# Altium footprint library vertigo.PcbLib: 115 footprints (part 7 of 8)
Each footprint in its own frame and in the unit in brackets; x right, y up, seen from the top. Pads: shape width x height; smd on the part's side, far side on the other; paste and mask are expansions set on the pad; w line width, h text height; cw(c..) or ccw(c..) is an arc to the next point about the centre after c.
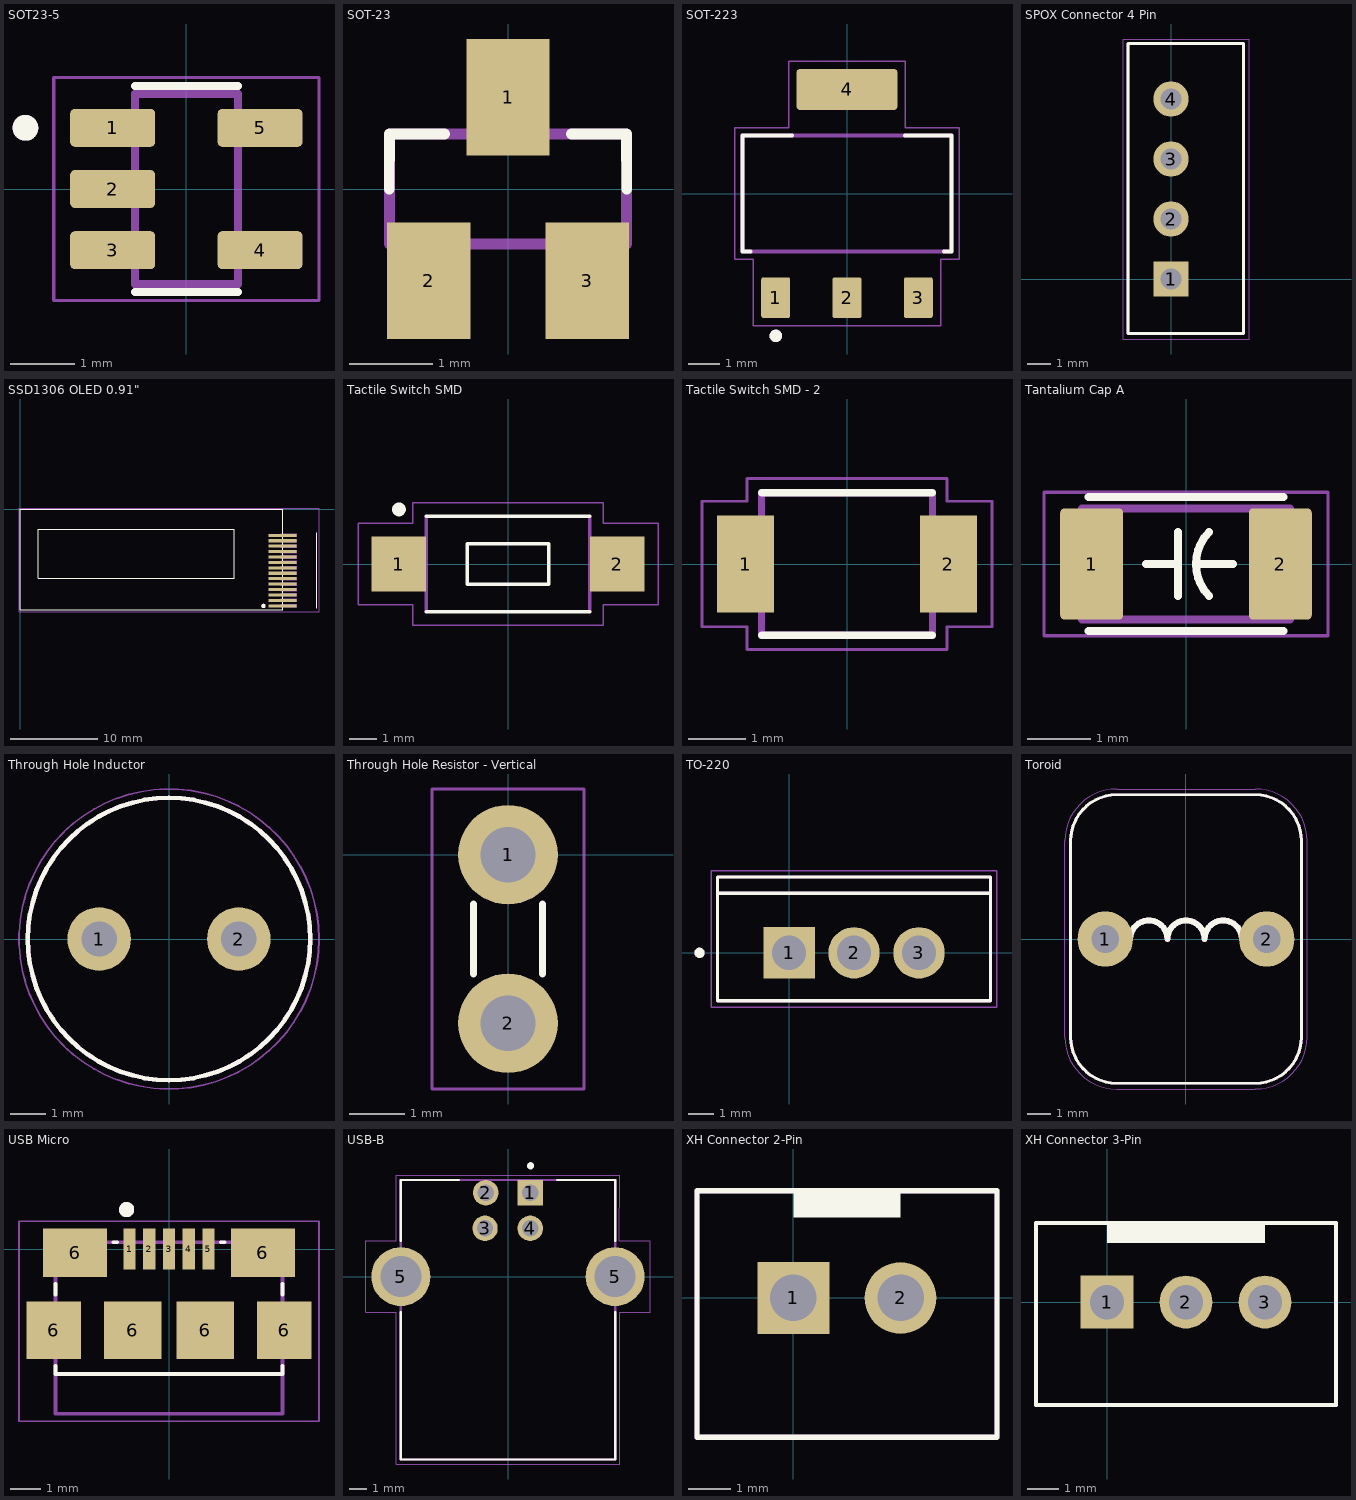
[diagram p6: the footprints below, top view; thin cyan lines are the x and y axes]

## SOT23-5 [mm] "SOT23-5L Package"
pads (5):
  rrect25% 1.32x0.59 smd: 1(-1.145,0.95) 2(-1.145,0) 3(-1.145,-0.95) 4(1.145,-0.95) 5(1.145,0.95)
Top Overlay:
  circle w0.2: c-2.5,0.95 r0.1
  lines w0.127: -0.8,-1.6 0.8,-1.6 ; -0.8,1.6 0.8,1.6
Mechanical 13:
  circle w0.2: c-2.5,0.95 r0.1
  lines w0.127: -0.8,-1.48 0.8,-1.48 0.8,1.48 -0.8,1.48 -0.8,-1.48
Mechanical 15:
  lines w0.05: -2.06,-1.73 -2.06,1.73 2.06,1.73 2.06,-1.73 -2.06,-1.73
3D body "ld3985m33r.stp": height 1.19, standoff 0, extent -1.403,-1.475 1.397,1.475

## SOT-23 [mm] "SOT-23 Package"
pads (3):
  rect 1x1.4 smd: 1(0,1.1) 2(-0.95,-1.1) 3(0.95,-1.1)
Top Overlay:
  lines w0.127: -1.423,0 -1.422,0.66 -0.762,0.66 ; 0.762,0.66 1.422,0.66 1.423,0
Mechanical 13:
  region: 0.229,0.711 -0.229,0.711 -0.229,1.295 0.229,1.295
  region: 1.168,-1.297 0.712,-1.297 0.712,-0.711 1.168,-0.711
  region: -0.711,-1.296 -1.169,-1.296 -1.169,-0.711 -0.711,-0.711
  lines w0.127: -1.422,-0.66 1.422,-0.66 1.422,0.66 -1.422,0.66 -1.422,-0.66
3D body "BCW31--3DModel-STEP-56544.STEP": height 1.14, standoff 0, extent -1.45,-1.2 1.45,1.2

## SOT-223 [mm] "SOT-223 Package"
pads (4):
  rrect15% 0.93x1.31 smd: 1(-2.29,-3.345) 2(0,-3.345) 3(2.29,-3.345)
  rrect15% 3.24x1.31 smd: 4(0,3.345)
Top Overlay:
  circle w0.2: c-2.286,-4.572 r0.1
  lines w0.127: -3.1,-1.86 -3.36,-1.86 -3.36,1.86 -1.76,1.86 ; 1.87,1.86 3.36,1.86 3.36,-1.86 3.11,-1.86
Mechanical 13:
  circle w0.2: c-2.286,-4.572 r0.1
  lines w0.127: -3.36,-1.86 -3.36,1.86 3.36,1.86 3.36,-1.86 -3.36,-1.86
Mechanical 15:
  lines w0.05: -3.61,-2.11 -3.61,2.11 -1.87,2.11 -1.87,4.25 1.87,4.25 1.87,2.11 3.61,2.11 3.61,-2.11 3.01,-2.11 3.01,-4.25 -3.01,-4.25 -3.01,-2.11 -3.61,-2.11
3D body "AMS1117.STEP": height 1.8, standoff 0, extent -3.251,-3.499 3.251,3.499

## SPOX Connector 4 Pin [mm] "Mini-Molex Connector 4 Pin"
pads (4):
  rect 1.5x1.5 hole 0.9: 1(0,0)
  round 1.5 hole 0.9: 2(0,2.54) 3(0,5.08) 4(0,7.62)
Top Overlay:
  lines w0.127: -1.813,-2.314 -1.813,9.98 3.062,9.98 3.062,-2.314 -1.813,-2.314
Mechanical 13:
  lines w0.127: -1.813,-2.314 -1.813,9.98 3.062,9.98 3.062,-2.314 -1.813,-2.314
Mechanical 15:
  lines w0.05: -2.032,-2.54 3.302,-2.54 3.302,10.16 -2.032,10.16 -2.032,-2.54
3D body "SPOX4X1.stp": height 5.95, standoff -3.45, extent -1.826,-2.367 3.074,10.033

## SSD1306 OLED 0.91" [mm] "SSD1306 OLED 0.91\""
pads (14):
  rect 3.2x0.35 smd paste+0: 1(30.002,-11.031) 2(30.002,-10.411) 3(30.002,-9.791) 4(30.002,-9.171) 5(30.002,-8.551) 6(30.002,-7.931) 7(30.002,-7.311) 8(30.002,-6.691) 9(30.002,-6.071) 10(30.002,-5.451) 11(30.002,-4.831) 12(30.002,-4.211) 13(30.002,-3.591) 14(30.002,-2.971)
Top Overlay:
  circle w0.254: c27.813,-11.049 r0.127
  lines w0.127: 0,-11.5 0,0 30,0 ; 0.002,-11.501 30.002,-11.501 30.002,-0.001 ; 33.909,-11.319 33.909,-2.683 ; 2.1,-7.859 24.484,-7.859 24.484,-2.275 2.1,-2.275 2.1,-7.859
Mechanical 3:
  region: 29.802,-11.206 29.802,-10.856 31.602,-10.856 31.602,-11.206
  region: 29.802,-10.586 29.802,-10.236 31.602,-10.236 31.602,-10.586
  region: 29.802,-9.966 29.802,-9.616 31.602,-9.616 31.602,-9.966
  region: 29.802,-9.346 29.802,-8.996 31.602,-8.996 31.602,-9.346
  region: 29.802,-8.726 29.802,-8.376 31.602,-8.376 31.602,-8.726
  region: 29.802,-8.106 29.802,-7.756 31.602,-7.756 31.602,-8.106
  region: 29.802,-7.486 29.802,-7.136 31.602,-7.136 31.602,-7.486
  region: 29.802,-6.866 29.802,-6.516 31.602,-6.516 31.602,-6.866
  region: 29.802,-6.246 29.802,-5.896 31.602,-5.896 31.602,-6.246
  region: 29.802,-5.626 29.802,-5.276 31.602,-5.276 31.602,-5.626
  region: 29.802,-5.006 29.802,-4.656 31.602,-4.656 31.602,-5.006
  region: 29.802,-4.386 29.802,-4.036 31.602,-4.036 31.602,-4.386
  region: 29.802,-3.766 29.802,-3.416 31.602,-3.416 31.602,-3.766
  region: 29.802,-3.146 29.802,-2.796 31.602,-2.796 31.602,-3.146
Mechanical 15:
  lines w0.05: -0.127,-11.684 34.163,-11.684 34.163,0.127 -0.127,0.127 -0.127,-11.684
3D body "0.91in OLED - Folded Flush - Without Glass.stp": height 0.51, standoff -0.11, extent 0,-11.505 34.07,0

## Tactile Switch SMD [mm] "2PS-6-3-2.5 SMD"
pads (2):
  rect 2x2 smd: 1(-4,0) 2(4,0)
Top Overlay:
  circle w0.254: c-4,2 r0.127
  lines w0.127: -3,-1.75 3,-1.75 ; -3,1.75 3,1.75 ; -1.5,-0.75 -1.5,0.75 1.5,0.75 1.5,-0.75 -1.5,-0.75
Mechanical 13:
  lines w0.127: -3,-1.75 -3,1.75 ; 3,-1.75 3,1.75
Mechanical 15:
  lines w0.05: -5.5,-1.5 -5.5,1.5 -3.5,1.5 -3.5,2.25 3.5,2.25 3.5,1.5 5.5,1.5 5.5,-1.5 3.5,-1.5 3.5,-2.25 -3.5,-2.25 -3.5,-1.5 -5.5,-1.5
3D body "RS-032G05A3-SM RT--3DModel-STEP-56544.STEP": height 4.3, standoff 0, extent -4,-1.75 4,1.75

## Tactile Switch SMD - 2 [mm] "2.5*3mm"
pads (2):
  rect 1x1.7 smd: 1(-1.778,0) 2(1.778,0)
Top Overlay:
  lines w0.127: -1.5,-1.25 1.5,-1.25 ; -1.5,1.25 1.5,1.25
Mechanical 13:
  lines w0.127: -1.5,-1.25 -1.5,1.25 1.5,1.25 1.5,-1.25 -1.5,-1.25
Mechanical 15:
  lines w0.05: -2.54,-1.1 -1.75,-1.1 -1.75,-1.5 1.75,-1.5 1.75,-1.1 2.54,-1.1 2.54,1.1 1.75,1.1 1.75,1.5 -1.75,1.5 -1.75,1.1 -2.54,1.1 -2.54,-1.1
3D body "B3U-1000P--3DModel-STEP-56544.STEP": height 1.75, standoff 0, extent -2,-1.25 2,1.25

## Tantalium Cap A [mm] "Size A Package"
pads (2):
  rrect14% 1x1.77 smd: 1(-1.5,0) 2(1.5,0)
Top Overlay:
  lines w0.127: -1.55,-1.065 1.55,-1.065 ; -1.55,1.065 1.55,1.065 ; -0.635,0 -0.127,0 ; -0.127,-0.508 -0.127,0.508 ; 0.2,0 0.75,0 ; 0.369,-0.508 cw(c0.877,0) 0.369,0.508
Mechanical 13:
  lines w0.127: -1.65,-0.88 -1.65,0.88 1.65,0.88 1.65,-0.88 -1.65,-0.88
Mechanical 15:
  lines w0.05: -2.26,-1.14 -2.26,1.14 2.26,1.14 2.26,-1.14 -2.26,-1.14
3D body "TBJA475K020JBLC0024.STEP": height 1.8, standoff 0, extent -1.6,-0.8 1.6,0.8

## Through Hole Inductor [mm]
pads (2):
  round 1.8 hole 1: 1(-1.98,0) 2(1.98,0)
Top Overlay:
  circle w0.127: c0,0 r4
Mechanical 13:
  circle w0.127: c0,0 r4
Mechanical 15:
  circle w0.05: c0,0 r4.25
3D body "inductor 8X10MM_V2.STEP": height 8.11, standoff -3, extent -4.11,-4.11 4.11,4.11

## Through Hole Resistor - Vertical [mm] "High-Power Vertical Resistor"
pads (2):
  round 1.8 hole 1: 1(0,0) 2(0,-3.05)
Top Overlay:
  lines w0.127: -0.625,-2.159 -0.625,-0.889 ; 0.625,-2.159 0.625,-0.889
Mechanical 15:
  lines w0.05: -1.375,-4.238 -1.375,1.188 1.375,1.188 1.375,-4.238 -1.375,-4.238
3D body "Resistor TH vertical 2,54.stp": height 8.18, standoff -2, extent -1.15,-2.965 1.15,0.9

## TO-220 [mm] "TO-220 Package"
pads (3):
  rect 2.01x2.01 hole 1.34: 1(0,0)
  round 2.01 hole 1.34: 2(2.54,0) 3(5.08,0)
Top Overlay:
  circle w0.2: c-3.5,0 r0.1
  lines w0.127: -2.8,2.325 7.88,2.325 ; -2.8,2.325 -2.8,2.96 7.88,2.96 7.88,2.325 ; -2.8,2.325 -2.8,-1.87 7.88,-1.87 7.88,2.325
Mechanical 13:
  circle w0.2: c-3.5,0 r0.1
  lines w0.127: -2.8,2.325 7.88,2.325 ; -2.8,2.325 -2.8,2.96 7.88,2.96 7.88,2.325 ; -2.8,2.325 -2.8,-1.87 7.88,-1.87 7.88,2.325
Mechanical 15:
  lines w0.05: -3.05,-2.13 -3.05,3.21 8.13,3.21 8.13,-2.13 -3.05,-2.13
3D body "IRF3205PBF.STEP": height 21.24, standoff -10, extent -2.54,-1.478 7.62,2.718

## Toroid [mm] "Toroid Inductor"
pads (2):
  round 2.4 hole 1.2: 1(-3.5,0) 2(3.5,0)
Top Overlay:
  lines w0.127: -5,-4.25 ccw(c-3,-4.25) -3,-6.25 3,-6.25 ccw(c3,-4.25) 5,-4.25 5,4.25 ccw(c3,4.25) 3,6.25 -3,6.25 ccw(c-3,4.25) -5,4.25 -5,-4.25
  lines w0.254: -2.416,0 cw(c-1.61,0) -0.805,0 cw(c0,0) 0.805,0 cw(c1.61,0) 2.416,0
Mechanical 13:
  lines w0.127: -5,-4.25 ccw(c-3,-4.25) -3,-6.25 3,-6.25 ccw(c3,-4.25) 5,-4.25 5,4.25 ccw(c3,4.25) 3,6.25 -3,6.25 ccw(c-3,4.25) -5,4.25 -5,-4.25
  lines w0.254: -2.416,0 cw(c-1.61,0) -0.805,0 cw(c0,0) 0.805,0 cw(c1.61,0) 2.416,0
Mechanical 15:
  lines w0.05: -5.25,-4.25 ccw(c-3,-4.25) -3,-6.5 3,-6.5 ccw(c3,-4.25) 5.25,-4.25 5.25,4.25 ccw(c3,4.25) 3,6.5 -3,6.5 ccw(c-3,4.25) -5.25,4.25 -5.25,-4.25
3D body "User Library-VTP-XXXXX (Premier Magnetics).step": height 2.42, standoff -16.04, extent -3.38,-7.987 3.33,8.853

## USB Micro [mm] "USB Micro"
pads (11):
  rect 0.4x1.35 smd: 1(-1.3,0) 2(-0.65,0) 3(0,0) 4(0.65,0) 5(1.3,0)
  rect 1.8x1.9 smd: 6(-3.8,-2.675) 6(3.8,-2.675)
  rect 2.1x1.6 smd: 6(-3.1,-0.125) 6(3.1,-0.125)
  rect 1.9x1.9 smd: 6(-1.2,-2.675) 6(1.2,-2.675)
Top Overlay:
  circle w0.3: c-1.4,1.3 r0.1
  lines w0.127: -3.75,-3.85 -3.75,-4.125 3.75,-4.125 3.75,-3.85 ; -3.75,-1.5 -3.75,-1.15 ; -1.83,0.225 -1.72,0.225 ; 1.72,0.225 1.83,0.225 ; 3.75,-1.5 3.75,-1.15
Mechanical 13:
  circle w0.3: c-1.4,1.3 r0.1
  lines w0.127: -3.75,-4.125 3.75,-4.125 ; -3.75,-4.125 -3.75,0.225 3.75,0.225 3.75,-4.125 ; -3.75,-4.125 -3.75,-5.436 3.75,-5.436 3.75,-4.125
Mechanical 15:
  lines w0.05: -4.95,-5.686 -4.95,0.925 4.95,0.925 4.95,-5.686 -4.95,-5.686
3D body "micro USB.STEP": height 2.68, standoff -0.24, extent -3.987,-5.267 3.987,0.159

## USB-B [mm] "Type B"
pads (6):
  rect 1.428x1.428 hole 0.92: 1(1.25,4.71)
  round 1.428 hole 0.92: 2(-1.25,4.71) 3(-1.29,2.71) 4(1.25,2.71)
  round 3.316 hole 2.3: 5(-6.02,0) 5(6.02,0)
Top Overlay:
  circle w0.2: c1.27,6.223 r0.1
  lines w0.127: -6.02,-2 -6.02,-10.28 6.02,-10.28 6.02,-2 ; -6.02,2 -6.02,5.43 ; -6,5.43 -2.75,5.43 ; 2.75,5.43 6.02,5.43 6.02,2
Mechanical 13:
  lines w0.127: -6.02,-10.28 6.02,-10.28 6.02,5.43 -6.02,5.43 -6.02,-10.28
Mechanical 15:
  lines w0.05: -8,-2 -8,2 -6.27,2 -6.27,5.68 6.27,5.68 6.25,2 8,2 8,-2 6.27,-2 6.27,-10.53 -6.27,-10.53 -6.27,-2 -8,-2
3D body "292304-5.stp": height 11.55, standoff -3.87, extent -7.195,-10.25 7.195,5.45

## XH Connector 2-Pin [mm]
pads (2):
  rect 1.7x1.7 hole 1.1: 1(0,0)
  round 1.7 hole 1.1: 2(2.54,0)
Top Overlay:
  rectangle: 0,1.905 2.54,2.54
  lines w0.127: -2.286,-3.302 4.826,-3.302 4.826,2.54 -2.286,2.54 -2.286,-3.302
Mechanical 13:
  lines w0.127: -2.286,-3.302 4.826,-3.302 4.826,2.54 -2.286,2.54 -2.286,-3.302
3D body "JST - XH - Thru - 2Pin - 2.5mm (Genuine).stp": height 7.21, standoff -3, extent -2.317,-3.353 4.857,2.489

## XH Connector 3-Pin [mm] "XH Connector 3-Pin"
pads (3):
  rect 1.7x1.7 hole 1.1: 1(0,0)
  round 1.7 hole 1.1: 2(2.54,0) 3(5.08,0)
Top Overlay:
  rectangle: 0,1.905 5.08,2.54
  lines w0.127: -2.286,-3.302 7.366,-3.302 7.366,2.54 -2.286,2.54 -2.286,-3.302
Mechanical 13:
  lines w0.127: -2.286,-3.302 -2.286,2.54 7.366,2.54 7.366,-3.302 -2.286,-3.302
3D body "JST - XH - Thru - 3Pin - 2.5mm (Genuine).stp": height 7.21, standoff -3, extent -2.297,-3.302 7.377,2.54